# Altium footprint library 我的器件.PCBLIB: 450 footprints (part 6 of 29)
Each footprint in its own frame and in the unit in brackets; x right, y up, seen from the top. Pads: shape width x height; smd on the part's side, far side on the other; paste and mask are expansions set on the pad; w line width, h text height; cw(c..) or ccw(c..) is an arc to the next point about the centre after c.
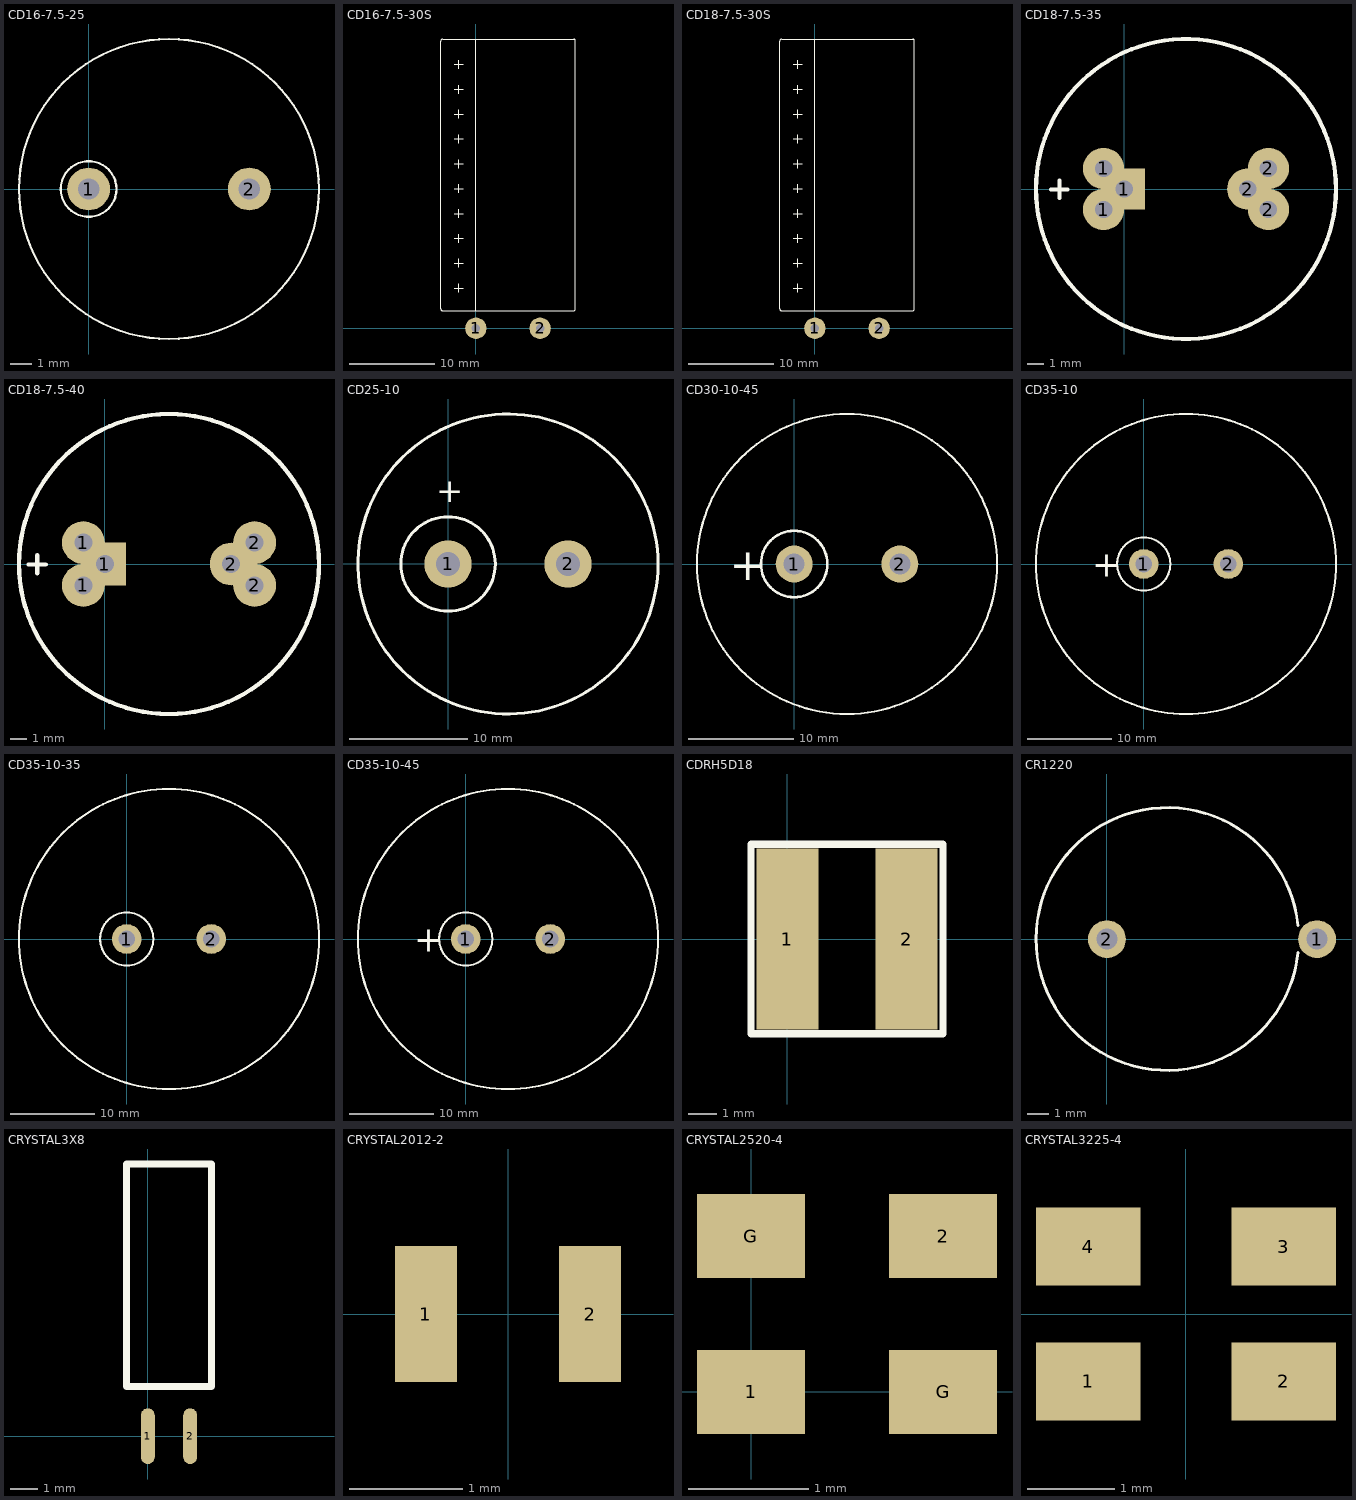
[diagram p5: the footprints below, top view; thin cyan lines are the x and y axes]

## CD16-7.5-25 [mm]
pads (2):
  round 2 hole 1: 1(0,0) 2(7.5,0)
Top Overlay:
  circle w0.1: c0,0 r1.3
  circle w0.1: c3.75,0 r7
3D body: height 25.5, standoff 0.5, extent -4.187,-7.984 11.75,7.984
3D body: height 25.51, standoff 25.5, extent -1.706,-5.489 9.25,5.489
3D body: height 0.5, standoff 0.49, extent -1.739,-5.456 9.239,5.5
3D body: height 0.5, standoff 0, extent -1.6,1.2 9.1,5.489
3D body: height 0.5, standoff 0, extent -1.6,-5.489 9.1,-1.2
3D body: height 1, standoff -2, extent -0.397,-0.399 0.4,0.399
3D body: height 1, standoff -2, extent 7.103,-0.399 7.9,0.399

## CD16-7.5-30S [mm]
pads (2):
  round 2.5 hole 1: 1(0,0) 2(7.5,0)
Top Overlay:
  lines w0.1: -2.5,4.7 -1.5,4.7 ; -2.5,7.6 -1.5,7.6 ; -2.5,10.5 -1.5,10.5 ; -2.5,13.4 -1.5,13.4 ; -2.5,16.3 -1.5,16.3 ; -2.5,19.2 -1.5,19.2 ; -2.5,22.1 -1.5,22.1 ; -2.5,25 -1.5,25 ; -2.5,27.9 -1.5,27.9 ; -2.5,30.8 -1.5,30.8 ; -2,4.2 -2,5.2 ; -2,7.1 -2,8.1 ; -2,10 -2,11 ; -2,12.9 -2,13.9 ; -2,15.8 -2,16.8 ; -2,18.7 -2,19.7 ; -2,21.6 -2,22.6 ; -2,24.5 -2,25.5 ; -2,27.4 -2,28.4 ; -2,30.3 -2,31.3 ; 0,2.05 0,33.775 ; -4.1,2.3 ccw(c-3.85,2.3) -3.85,2.05 -1.9,2.05 11.2,2.05 11.425,2.05 ccw(c11.425,2.225) 11.6,2.225 11.6,33.575 ccw(c11.4,33.575) 11.4,33.775 -3.85,33.775 ccw(c-3.85,33.525) -4.1,33.525 -4.1,2.3
3D body: height 1, standoff -8.8, extent 7.124,-0.325 7.923,0.472
3D body: height 15.94, standoff 0, extent -4.234,1.925 11.734,33.925
3D body: height 12.96, standoff 3, extent -1.24,24.025 8.74,34.125
3D body: height 12.96, standoff 3, extent -1.24,1.775 8.74,11.875
3D body: height 8.4, standoff 7.6, extent -0.4,0.075 0.398,1.875
3D body: height 8.4, standoff 7.6, extent 7.1,0.075 7.898,1.875
3D body: height 1, standoff -8.8, extent -0.375,-0.4 0.423,0.397

## CD18-7.5-30S [mm]
pads (2):
  round 2.5 hole 1: 1(0,0) 2(7.5,0)
Top Overlay:
  lines w0.1: -2.5,4.7 -1.5,4.7 ; -2.5,7.6 -1.5,7.6 ; -2.5,10.5 -1.5,10.5 ; -2.5,13.4 -1.5,13.4 ; -2.5,16.3 -1.5,16.3 ; -2.5,19.2 -1.5,19.2 ; -2.5,22.1 -1.5,22.1 ; -2.5,25 -1.5,25 ; -2.5,27.9 -1.5,27.9 ; -2.5,30.8 -1.5,30.8 ; -2,4.2 -2,5.2 ; -2,7.1 -2,8.1 ; -2,10 -2,11 ; -2,12.9 -2,13.9 ; -2,15.8 -2,16.8 ; -2,18.7 -2,19.7 ; -2,21.6 -2,22.6 ; -2,24.5 -2,25.5 ; -2,27.4 -2,28.4 ; -2,30.3 -2,31.3 ; 0,2.05 0,33.775 ; -4.1,2.3 ccw(c-3.85,2.3) -3.85,2.05 -1.9,2.05 11.2,2.05 11.425,2.05 ccw(c11.425,2.225) 11.6,2.225 11.6,33.575 ccw(c11.4,33.575) 11.4,33.775 -3.85,33.775 ccw(c-3.85,33.525) -4.1,33.525 -4.1,2.3
3D body: height 2, standoff -10.6, extent -0.376,-0.325 0.423,0.472
3D body: height 9.5, standoff 8.7, extent 7.1,0.075 7.899,1.875
3D body: height 9.5, standoff 8.7, extent -0.399,0 0.399,1.8
3D body: height 16.04, standoff 2.1, extent -3.236,1.775 10.736,11.875
3D body: height 16.04, standoff 2.1, extent -3.236,24.025 10.736,34.125
3D body: height 18.13, standoff 0, extent -5.332,1.925 12.832,33.925
3D body: height 2, standoff -10.6, extent 7.124,-0.325 7.923,0.472

## CD18-7.5-35 [mil]
pads (6):
  round 100 hole 42: 1(-50,-50) 1(-50,50) 2(300,0) 2(350,-50) 2(350,50)
  rect 100x100 hole 42: 1(0,0)
Top Overlay:
  circle w10: c150,0 r364.17
  lines w10: -178.15,-0.98 -137.8,-0.98 ; -157.48,-21.65 -157.48,20.67
3D body: height 1457.09, standoff 0, extent -104.87,-255.4 404.92,255.4
3D body: height 1456.69, standoff 0, extent -206.43,-357.56 507.28,357.56
3D body: height 39.37, standoff -78.74, extent -15.62,-15.71 15.75,15.73
3D body: height 39.37, standoff -78.74, extent 284.38,-15.71 315.75,15.73

## CD18-7.5-40 [mil]
pads (6):
  round 100 hole 42: 1(-50,-50) 1(-50,50) 2(295.28,0) 2(350,-50) 2(350,50)
  rect 100x100 hole 42: 1(0,0)
Top Overlay:
  circle w10: c150,0 r350.39
  lines w10: -178.15,-0.98 -137.8,-0.98 ; -157.48,-21.65 -157.48,20.67
3D body: height 39.37, standoff -78.74, extent 279.66,-15.71 311.03,15.73
3D body: height 39.37, standoff -78.74, extent -15.62,-15.71 15.75,15.73
3D body: height 1653.94, standoff 19.68, extent -103.88,-255.4 405.91,255.41
3D body: height 1653.54, standoff 19.68, extent -206.43,-357.56 507.29,357.56
3D body: height 19.68, standoff 0, extent -104.87,-255.4 404.92,255.4

## CD25-10 [mm]
pads (2):
  round 4 hole 2: 1(0,0) 2(10.16,0)
Top Overlay:
  circle w0.254: c0.005,0 r4
  circle w0.254: c5.08,0 r12.7
  text "+" at -1.016,5.207 h2
3D body: height 25.5, standoff 0, extent -3.883,-8.982 14.046,8.982
3D body: height 25.4, standoff 0, extent -7.371,-12.471 17.531,12.479

## CD30-10-45 [mm]
pads (2):
  round 3.5 / inner round 3.5 / far side round 5 hole 2: 1(0,0) 2(10,0)
Top Overlay:
  circle w0.2: c5,0 r14.2
  circle w0.25: c0,0 r3.144
  text "+" at -6.096,-1.524 h3
3D body: height 47, standoff 0, extent -10.08,-15.17 20.2,15.17
3D body: height 47.01, standoff -0.01, extent -5.913,-10.978 16,10.979
3D body: height 0.3, standoff -2, extent -0.686,-0.711 0.711,0.686
3D body: height 0.3, standoff -2, extent 9.314,-0.711 10.711,0.686

## CD35-10 [mm]
pads (2):
  round 3.5 / inner round 3.5 / far side round 5 hole 2: 1(0,0) 2(10,0)
Top Overlay:
  circle w0.25: c5,0 r17.75
  circle w0.25: c0,0 r3.144
  text "+" at -6.096,-1.524 h3
3D body: height 32, standoff 0, extent -12.437,-17.44 22.425,17.49
3D body: height 32.1, standoff 0, extent -7.949,-12.975 17.949,12.974
3D body: height 0.3, standoff -2, extent -0.686,-0.711 0.711,0.686
3D body: height 0.3, standoff -2, extent 9.314,-0.711 10.711,0.686

## CD35-10-35 [mm]
pads (2):
  round 3.5 / inner round 3.5 / far side round 5 hole 2: 1(0,0) 2(10,0)
Top Overlay:
  circle w0.25: c0,0 r3.144
  circle w0.25: c5,0 r17.75
3D body: height 36, standoff 0, extent -12.437,-17.44 22.425,17.49
3D body: height 36.09, standoff -0.01, extent -7.949,-12.975 17.949,12.974
3D body: height 0.3, standoff -2, extent -0.686,-0.711 0.711,0.686
3D body: height 0.3, standoff -2, extent 9.314,-0.711 10.711,0.686

## CD35-10-45 [mm]
pads (2):
  round 3.5 / inner round 3.5 / far side round 5 hole 2: 1(0,0) 2(10,0)
Top Overlay:
  circle w0.25: c0,0 r3.144
  circle w0.25: c5,0 r17.75
  text "+" at -6.096,-1.524 h3
3D body: height 46.01, standoff 0, extent -7.949,-12.975 17.949,12.974
3D body: height 46, standoff 0, extent -12.437,-17.44 22.425,17.49
3D body: height 0.3, standoff -2, extent -0.686,-0.711 0.711,0.686
3D body: height 0.3, standoff -2, extent 9.314,-0.711 10.711,0.686

## CDRH5D18 [mm]
height 3
pads (2):
  rect 2.15x6.3 smd: 1(0,0) 2(4.15,0)
Top Overlay:
  lines w0.254: -1.27,-3.302 5.42,-3.302 5.42,3.302 -1.27,3.302 -1.27,-3.302

## CR1220 [mm]
height 4
pads (2):
  round 1.8 hole 1: 1(10,0) 2(0,0)
Top Overlay:
  lines w0.14: 9.09,-0.643 cw(c2.874,0.009) 9.092,0.643

## CRYSTAL3X8 [mm]
pads (2):
  oval 0.5x2 smd: 1(0,0) 2(1.524,0)
Top Overlay:
  lines w0.254: -0.762,1.778 2.286,1.778 2.286,9.779 -0.762,9.779 -0.762,1.778

## CRYSTAL2012-2 [mm]
pads (2):
  rect 0.55x1.2 smd: 1(-0.725,0) 2(0.725,0)
3D body: height 0.6, standoff 0.5, extent -0.95,-0.55 0.95,0.55
3D body: height 0.5, standoff 0.4, extent -0.975,-0.575 0.975,0.575
3D body: height 0.3, standoff 0, extent -1,-0.6 1,0.6

## CRYSTAL2520-4 [mm]
pads (4):
  rect 0.9x0.7 smd: 1(0,0) 2(1.6,1.3) G(0,1.3) G(1.6,0)
3D body: height 0.56, standoff 0.55, extent -0.199,-0.125 0,0.075
3D body: height 0.35, standoff 0, extent -0.45,-0.35 2.05,1.65
3D body: height 0.45, standoff 0.3, extent -0.425,-0.325 2.025,1.625
3D body: height 0.55, standoff 0.45, extent -0.375,-0.275 1.975,1.575

## CRYSTAL3225-4 [mm]
pads (4):
  rect 1.2x0.9 smd: 1(-1.125,-0.775) 2(1.125,-0.775) 3(1.125,0.775) 4(-1.125,0.775)
3D body: height 0.8, standoff 0.7, extent -1.5,-1.15 1.5,1.15
3D body: height 0.7, standoff 0.6, extent -1.55,-1.2 1.555,1.2
3D body: height 0.6, standoff 0, extent -1.6,-1.247 1.6,1.253